# Altium schematic symbol library altera.SCHLIB: 68 symbols (part 3 of 6) (continued)
## EPF10K100A-P240 (continued)
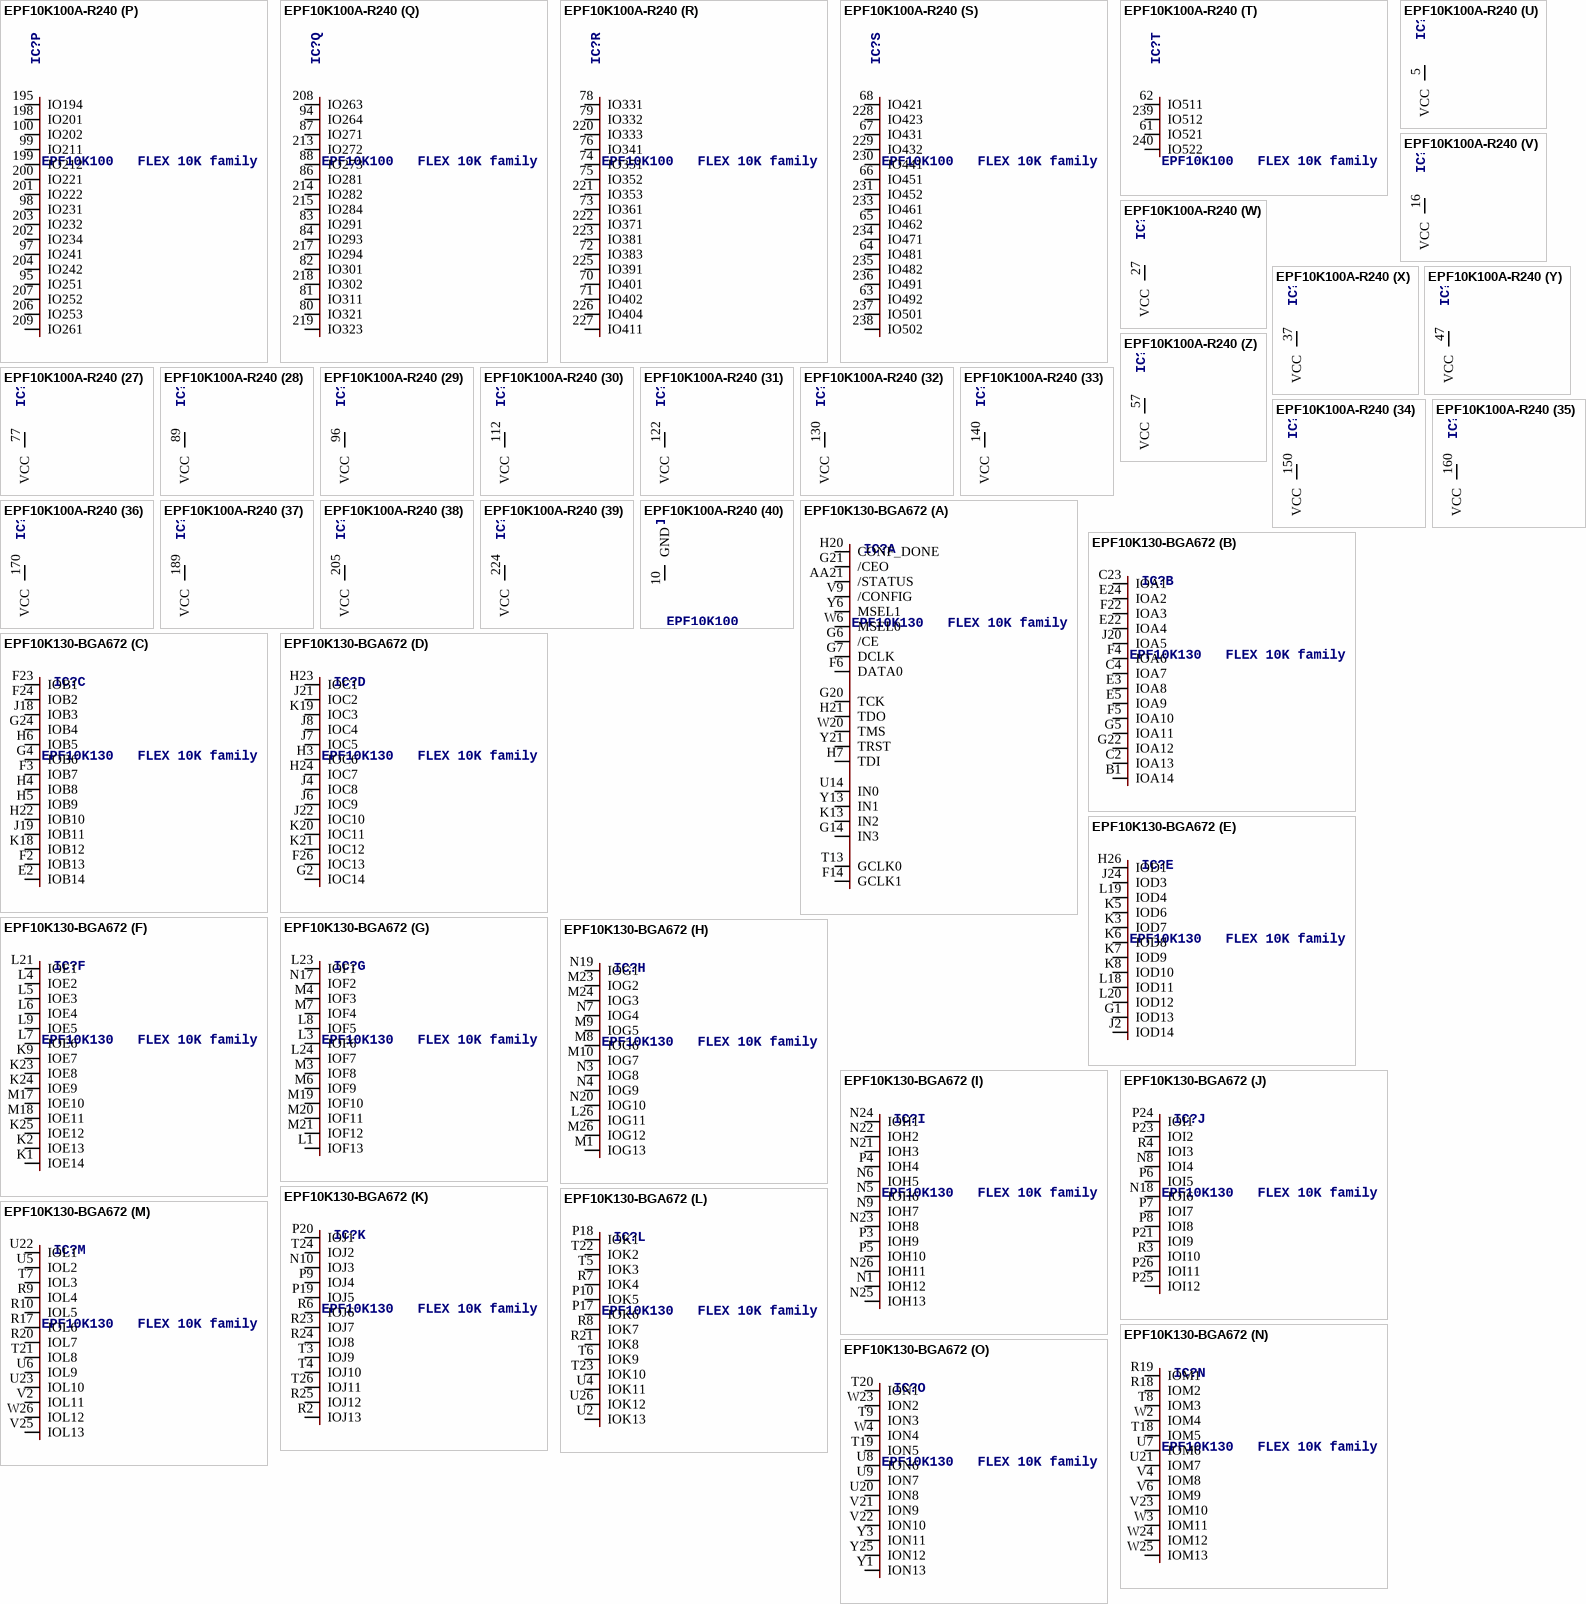
[diagram p23: symbols EPF10K100A-R240 to EPF10K130-BGA672]

## EPF10K100A-R240
designator IC?, comment EPF10K100   FLEX 10K family
MPN: EPF10K100ARC240-3N; OC_FARNELL: unknown; OC_NEWARK: 51R8800
footprint RQFP240
part A pins: 1 TCK, 2 CONF_DONE, 3 /CEO, 4 TDO, 58 TMS, 59 TRST, 60 /STATUS, 90 IN0, 91 GCLK0, 92 IN1, 121 /CONFIG, 123 MSEL1, 124 MSEL0, 177 TDI, 178 /CE, 179 DCLK, 180 DATA0, 210 IN2, 211 GCLK1, 212 IN3
part B pins: 6 IOA1, 7 IOA2, 8 IOA3, 9 IOA10, 11 IOA4, 171 IOA5, 172 IOA9, 173 IOA6, 174 IOA8, 175 IOA7
part C pins: 12 IOB1, 13 IOB2, 14 IOB16, 15 IOB3, 164 IOB5, 166 IOB6, 167 IOB9, 168 IOB8, 169 IOB7
part D pins: 17 IOC11, 18 IOC9, 19 IOC1, 20 IOC16, 21 IOC2, 159 IOC3, 161 IOC4, 162 IOC5, 163 IOC6
part E pins: 23 IOD1, 24 IOD2, 25 IOD3, 26 IOD4, 156 IOD5, 157 IOD6, 158 IOD7
part F pins: 28 IOE11, 29 IOE1, 30 IOE2, 152 IOE3, 153 IOE4, 154 IOE5
part G pins: 31 IOF7, 33 IOF1, 34 IOF2, 148 IOF3, 149 IOF4, 151 IOF5
part H pins: 35 IOG11, 36 IOG1, 38 IOG2, 144 IOG8, 146 IOG3, 147 IOG4
part I pins: 39 IOH1, 40 IOH2, 41 IOH3, 141 IOH4, 142 IOH8, 143 IOH5
part J pins: 43 IOI1, 44 IOI2, 45 IOI12, 137 IOI3, 138 IOI5, 139 IOI4
part K pins: 46 IOJ13, 48 IOJ1, 49 IOJ2, 133 IOJ14, 134 IOJ3, 136 IOJ5
part L pins: 50 IOK11, 51 IOK1, 53 IOK2, 129 IOK14, 131 IOK3, 132 IOK4
part M pins: 54 IOL1, 55 IOL2, 56 IOL3, 126 IOL11, 127 IOL4, 128 IOL5
part N pins: 109 IO113, 110 IO102, 111 IO91, 113 IO81, 114 IO71, 115 IO61, 116 IO51, 117 IO41, 118 IO31, 119 IO21, 120 IO11, 181 IO92, 182 IO101, 183 IO111, 184 IO121, 185 IO122
part O pins: 101 IO191, 102 IO181, 103 IO161, 105 IO151, 106 IO141, 107 IO131, 108 IO124, 186 IO132, 187 IO142, 188 IO143, 190 IO152, 191 IO164, 192 IO162, 193 IO171, 194 IO182, 196 IO192
part P pins: 95 IO251, 97 IO241, 98 IO231, 99 IO211, 100 IO202, 195 IO194, 198 IO201, 199 IO212, 200 IO221, 201 IO222, 202 IO234, 203 IO232, 204 IO242, 206 IO253, 207 IO252, 209 IO261
part Q pins: 80 IO321, 81 IO311, 82 IO301, 83 IO291, 84 IO293, 86 IO281, 87 IO271, 88 IO273, 94 IO264, 208 IO263, 213 IO272, 214 IO282, 215 IO284, 217 IO294, 218 IO302, 219 IO323
part R pins: 70 IO401, 71 IO402, 72 IO383, 73 IO361, 74 IO351, 75 IO352, 76 IO341, 78 IO331, 79 IO332, 220 IO333, 221 IO353, 222 IO371, 223 IO381, 225 IO391, 226 IO404, 227 IO411
part S pins: 63 IO492, 64 IO481, 65 IO462, 66 IO451, 67 IO431, 68 IO421, 228 IO423, 229 IO432, 230 IO441, 231 IO452, 233 IO461, 234 IO471, 235 IO482, 236 IO491, 237 IO501, 238 IO502
part T pins: 61 IO521, 62 IO511, 239 IO512, 240 IO522
part U pins: 5 VCC (power)
part V pins: 16 VCC (power)
part W pins: 27 VCC (power)
part X pins: 37 VCC (power)
part Y pins: 47 VCC (power)
part Z pins: 57 VCC (power)
part 27 pins: 77 VCC (power)
part 28 pins: 89 VCC (power)
part 29 pins: 96 VCC (power)
part 30 pins: 112 VCC (power)
part 31 pins: 122 VCC (power)
part 32 pins: 130 VCC (power)
part 33 pins: 140 VCC (power)
part 34 pins: 150 VCC (power)
part 35 pins: 160 VCC (power)
part 36 pins: 170 VCC (power)
part 37 pins: 189 VCC (power)
part 38 pins: 205 VCC (power)
part 39 pins: 224 VCC (power)
part 40 pins: 10 GND (power)
part 41 pins: 22 GND (power)
part 42 pins: 32 GND (power)
part 43 pins: 42 GND (power)
part 44 pins: 52 GND (power)
part 45 pins: 69 GND (power)
part 46 pins: 85 GND (power)
part 47 pins: 93 GND (power)
part 48 pins: 104 GND (power)
part 49 pins: 125 GND (power)
part 50 pins: 135 GND (power)
part 51 pins: 145 GND (power)
part 52 pins: 155 GND (power)
part 53 pins: 165 GND (power)
part 54 pins: 176 GND (power)
part 55 pins: 197 GND (power)
part 56 pins: 216 GND (power)
part 57 pins: 232 GND (power)

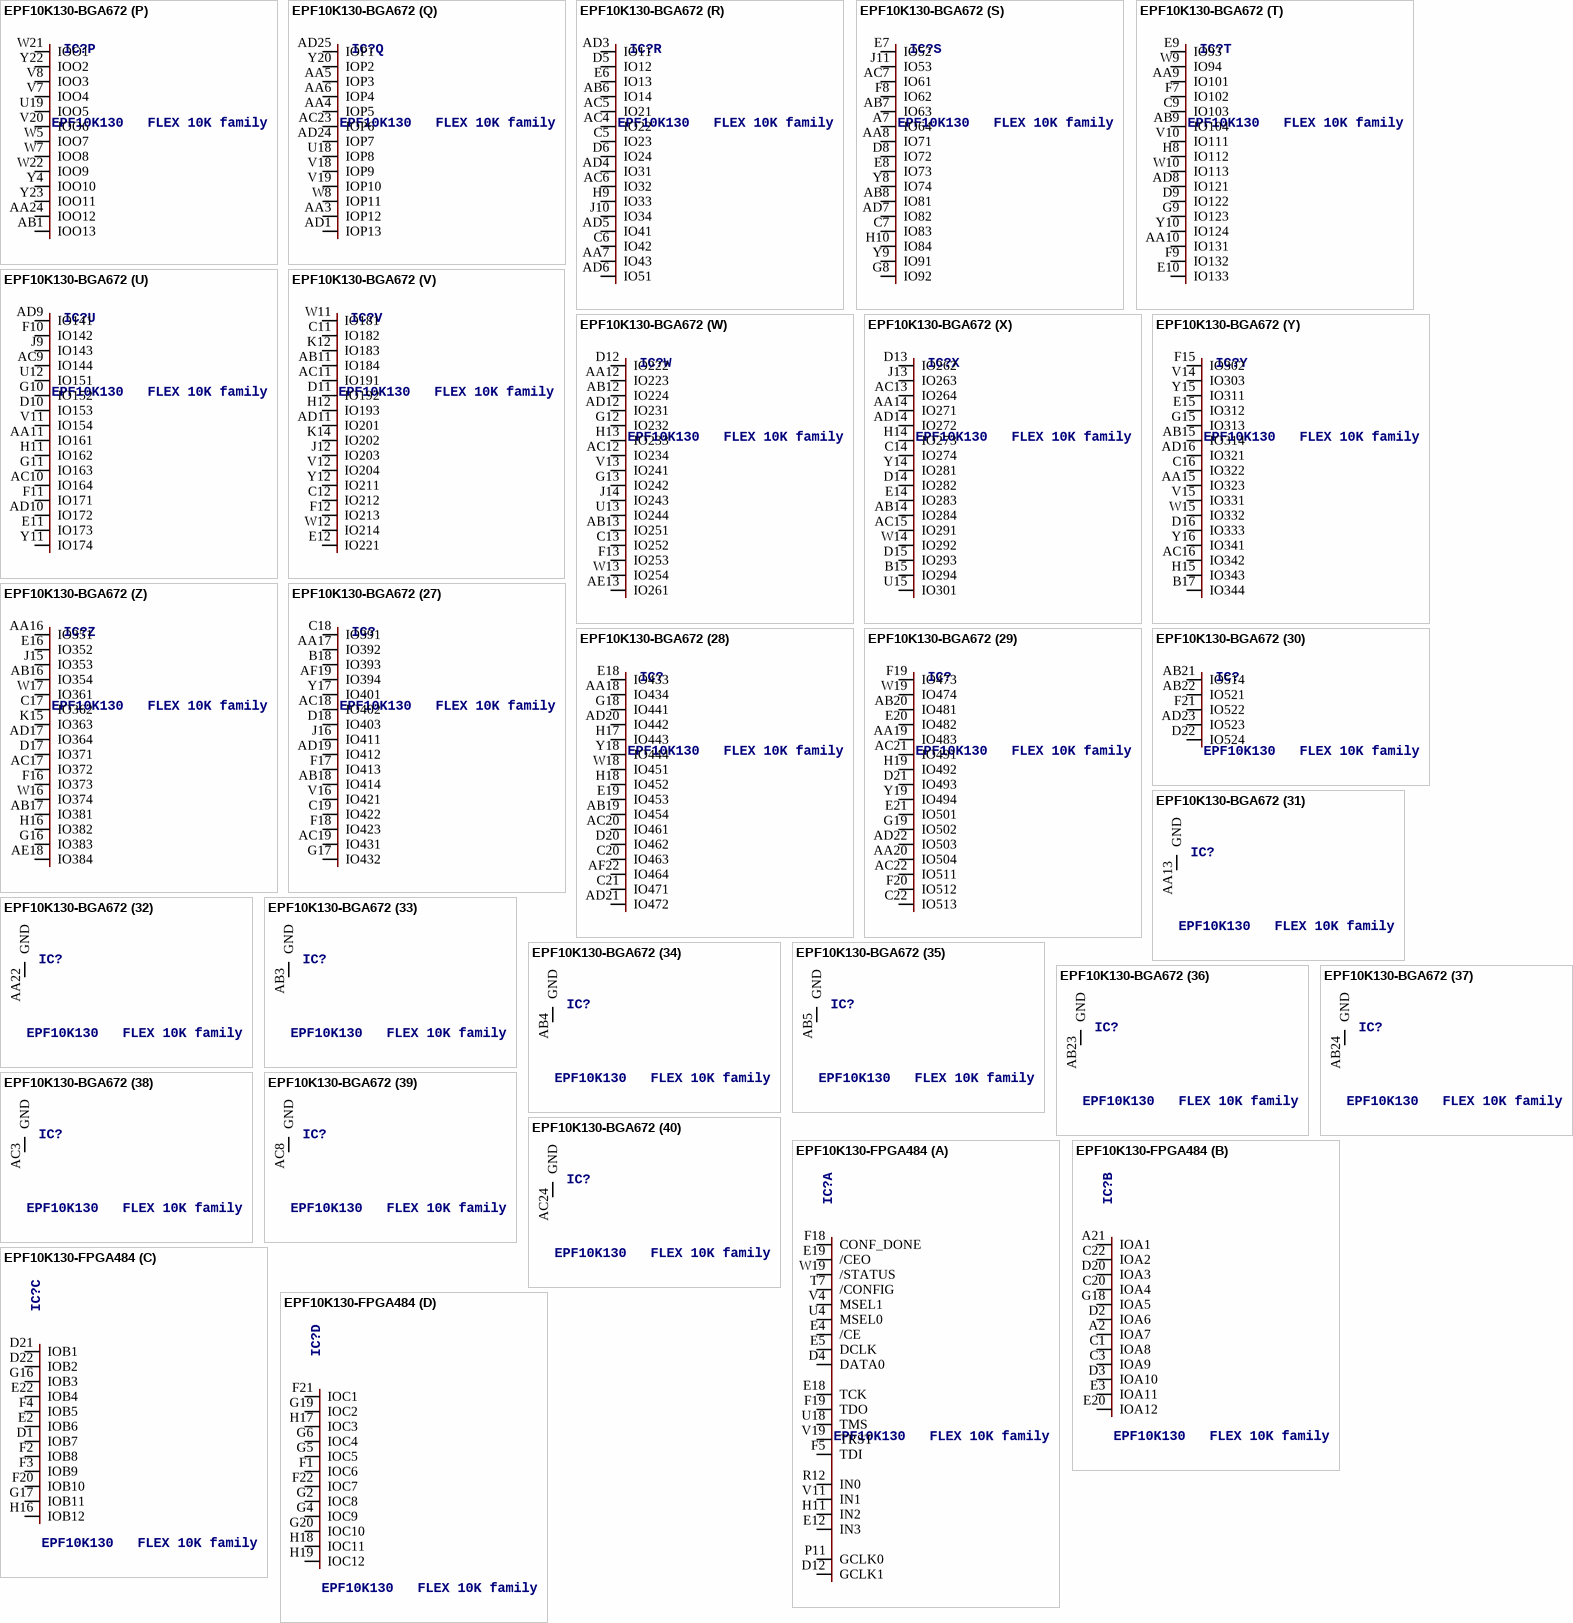
[diagram p24: symbols EPF10K130-BGA672 to EPF10K130-FPGA484]

## EPF10K130-BGA672
designator IC?, comment EPF10K130   FLEX 10K family
MPN: EPF10K130EFC672-1; OC_FARNELL: unknown; OC_NEWARK: 51R8863
footprint BGA672
part A pins: AA21 /STATUS, F6 DATA0, F14 GCLK1, G6 /CE, G7 DCLK, G14 IN3, G20 TCK, G21 /CEO, H7 TDI, H20 CONF_DONE, H21 TDO, K13 IN2, T13 GCLK0, U14 IN0, V9 /CONFIG, W6 MSEL0, W20 TMS, Y6 MSEL1, Y13 IN1, Y21 TRST
part B pins: B1 IOA14, C2 IOA13, C4 IOA7, C23 IOA1, E3 IOA8, E5 IOA9, E22 IOA4, E24 IOA2, F4 IOA6, F5 IOA10, F22 IOA3, G5 IOA11, G22 IOA12, J20 IOA5
part C pins: E2 IOB14, F2 IOB13, F3 IOB7, F23 IOB1, F24 IOB2, G4 IOB6, G24 IOB4, H4 IOB8, H5 IOB9, H6 IOB5, H22 IOB10, J18 IOB3, J19 IOB11, K18 IOB12
part D pins: F26 IOC13, G2 IOC14, H3 IOC6, H23 IOC1, H24 IOC7, J4 IOC8, J6 IOC9, J7 IOC5, J8 IOC4, J21 IOC2, J22 IOC10, K19 IOC3, K20 IOC11, K21 IOC12
part E pins: G1 IOD13, H26 IOD1, J2 IOD14, J24 IOD3, K3 IOD7, K5 IOD6, K6 IOD8, K7 IOD9, K8 IOD10, L18 IOD11, L19 IOD4, L20 IOD12
part F pins: K1 IOE14, K2 IOE13, K9 IOE7, K23 IOE8, K24 IOE9, K25 IOE12, L4 IOE2, L5 IOE3, L6 IOE4, L7 IOE6, L9 IOE5, L21 IOE1, M17 IOE10, M18 IOE11
part G pins: L1 IOF13, L3 IOF6, L8 IOF5, L23 IOF1, L24 IOF7, M3 IOF8, M4 IOF3, M6 IOF9, M7 IOF4, M19 IOF10, M20 IOF11, M21 IOF12, N17 IOF2
part H pins: L26 IOG11, M1 IOG13, M8 IOG6, M9 IOG5, M10 IOG7, M23 IOG2, M24 IOG3, M26 IOG12, N3 IOG8, N4 IOG9, N7 IOG4, N19 IOG1, N20 IOG10
part I pins: N1 IOH12, N5 IOH6, N6 IOH5, N9 IOH7, N21 IOH3, N22 IOH2, N23 IOH8, N24 IOH1, N25 IOH13, N26 IOH11, P3 IOH9, P4 IOH4, P5 IOH10
part J pins: N8 IOI4, N18 IOI6, P6 IOI5, P7 IOI7, P8 IOI8, P21 IOI9, P23 IOI2, P24 IOI1, P25 IOI12, P26 IOI11, R3 IOI10, R4 IOI3
part K pins: N10 IOJ3, P9 IOJ4, P19 IOJ5, P20 IOJ1, R2 IOJ13, R6 IOJ6, R23 IOJ7, R24 IOJ8, R25 IOJ12, T3 IOJ9, T4 IOJ10, T24 IOJ2, T26 IOJ11
part L pins: P10 IOK5, P17 IOK6, P18 IOK1, R7 IOK4, R8 IOK7, R21 IOK8, T5 IOK3, T6 IOK9, T22 IOK2, T23 IOK10, U2 IOK13, U4 IOK11, U26 IOK12
part M pins: R9 IOL4, R10 IOL5, R17 IOL6, R20 IOL7, T7 IOL3, T21 IOL8, U5 IOL2, U6 IOL9, U22 IOL1, U23 IOL10, V2 IOL11, V25 IOL13, W26 IOL12
part N pins: R18 IOM2, R19 IOM1, T8 IOM3, T18 IOM5, U7 IOM6, U21 IOM7, V4 IOM8, V6 IOM9, V23 IOM10, W2 IOM4, W3 IOM11, W24 IOM12, W25 IOM13
part O pins: T9 ION3, T19 ION5, T20 ION1, U8 ION6, U9 ION7, U20 ION8, V21 ION9, V22 ION10, W4 ION4, W23 ION2, Y1 ION13, Y3 ION11, Y25 ION12
part P pins: AA24 IOO12, AB1 IOO13, U19 IOO5, V7 IOO4, V8 IOO3, V20 IOO6, W5 IOO7, W7 IOO8, W21 IOO1, W22 IOO9, Y4 IOO10, Y22 IOO2, Y23 IOO11
part Q pins: AA3 IOP12, AA4 IOP5, AA5 IOP3, AA6 IOP4, AC23 IOP6, AD1 IOP13, AD24 IOP7, AD25 IOP1, U18 IOP8, V18 IOP9, V19 IOP10, W8 IOP11, Y20 IOP2
part R pins: AA7 IO43, AB6 IO14, AC4 IO22, AC5 IO21, AC6 IO32, AD3 IO11, AD4 IO31, AD5 IO41, AD6 IO51, C5 IO23, C6 IO42, D5 IO12, D6 IO24, E6 IO13, H9 IO33, J10 IO34
part S pins: A7 IO64, AA8 IO71, AB7 IO63, AB8 IO81, AC7 IO61, AD7 IO82, C7 IO83, D8 IO72, E7 IO52, E8 IO73, F8 IO62, G8 IO92, H10 IO84, J11 IO53, Y8 IO74, Y9 IO91
part T pins: AA9 IO101, AA10 IO131, AB9 IO104, AD8 IO121, C9 IO103, D9 IO122, E9 IO93, E10 IO133, F7 IO102, F9 IO132, G9 IO123, H8 IO112, V10 IO111, W9 IO94, W10 IO113, Y10 IO124
part U pins: AA11 IO161, AC9 IO144, AC10 IO164, AD9 IO141, AD10 IO172, D10 IO153, E11 IO173, F10 IO142, F11 IO171, G10 IO152, G11 IO163, H11 IO162, J9 IO143, U12 IO151, V11 IO154, Y11 IO174
part V pins: AB11 IO184, AC11 IO191, AD11 IO201, C11 IO182, C12 IO212, D11 IO192, E12 IO221, F12 IO213, H12 IO193, J12 IO203, K12 IO183, K14 IO202, V12 IO204, W11 IO181, W12 IO214, Y12 IO211
part W pins: AA12 IO223, AB12 IO224, AB13 IO251, AC12 IO234, AD12 IO231, AE13 IO261, C13 IO252, D12 IO222, F13 IO253, G12 IO232, G13 IO242, H13 IO233, J14 IO243, U13 IO244, V13 IO241, W13 IO254
part X pins: AA14 IO271, AB14 IO284, AC13 IO264, AC15 IO291, AD14 IO272, B15 IO294, C14 IO274, D13 IO262, D14 IO282, D15 IO293, E14 IO283, H14 IO273, J13 IO263, U15 IO301, W14 IO292, Y14 IO281
part Y pins: AA15 IO323, AB15 IO314, AC16 IO342, AD16 IO321, B17 IO344, C16 IO322, D16 IO333, E15 IO312, F15 IO302, G15 IO313, H15 IO343, V14 IO303, V15 IO331, W15 IO332, Y15 IO311, Y16 IO341
part Z pins: AA16 IO351, AB16 IO354, AB17 IO381, AC17 IO372, AD17 IO364, AE18 IO384, C17 IO362, D17 IO371, E16 IO352, F16 IO373, G16 IO383, H16 IO382, J15 IO353, K15 IO363, W16 IO374, W17 IO361
part 27 pins: AA17 IO392, AB18 IO414, AC18 IO402, AC19 IO431, AD19 IO412, AF19 IO394, B18 IO393, C18 IO391, C19 IO422, D18 IO403, F17 IO413, F18 IO423, G17 IO432, J16 IO411, V16 IO421, Y17 IO401
part 28 pins: AA18 IO434, AB19 IO454, AC20 IO461, AD20 IO442, AD21 IO472, AF22 IO464, C20 IO463, C21 IO471, D20 IO462, E18 IO433, E19 IO453, G18 IO441, H17 IO443, H18 IO452, W18 IO451, Y18 IO444
part 29 pins: AA19 IO483, AA20 IO504, AB20 IO481, AC21 IO491, AC22 IO511, AD22 IO503, C22 IO513, D21 IO493, E20 IO482, E21 IO501, F19 IO473, F20 IO512, G19 IO502, H19 IO492, W19 IO474, Y19 IO494
part 30 pins: AB21 IO514, AB22 IO521, AD23 IO523, D22 IO524, F21 IO522
part 31 pins: AA13 GND (power)
part 32 pins: AA22 GND (power)
part 33 pins: AB3 GND (power)
part 34 pins: AB4 GND (power)
part 35 pins: AB5 GND (power)
part 36 pins: AB23 GND (power)
part 37 pins: AB24 GND (power)
part 38 pins: AC3 GND (power)
part 39 pins: AC8 GND (power)
part 40 pins: AC24 GND (power)
part 41 pins: AD13 GND (power)
part 42 pins: AD18 GND (power)
part 43 pins: AE2 GND (power)
part 44 pins: AE25 GND (power)
part 45 pins: AF2 GND (power)
part 46 pins: AF25 GND (power)
part 47 pins: A2 GND (power)
part 48 pins: A25 GND (power)
part 49 pins: B2 GND (power)
part 50 pins: B25 GND (power)
part 51 pins: C3 GND (power)
part 52 pins: C10 GND (power)
part 53 pins: C24 GND (power)
part 54 pins: D3 GND (power)
part 55 pins: D4 GND (power)
part 56 pins: D19 GND (power)
part 57 pins: D23 GND (power)
part 58 pins: D24 GND (power)
part 59 pins: E4 GND (power)
part 60 pins: E23 GND (power)
part 61 pins: G23 GND (power)
part 62 pins: J5 GND (power)
part 63 pins: J23 GND (power)
part 64 pins: K4 GND (power)
part 65 pins: K10 GND (power)
part 66 pins: K17 GND (power)
part 67 pins: L11 GND (power)
part 68 pins: L16 GND (power)
part 69 pins: L22 GND (power)
part 70 pins: M5 GND (power)
part 71 pins: M12 GND (power)
part 72 pins: M14 GND (power)
part 73 pins: M15 GND (power)
part 74 pins: N13 GND (power)
part 75 pins: N14 GND (power)
part 76 pins: P13 GND (power)
part 77 pins: P14 GND (power)
part 78 pins: P22 GND (power)
part 79 pins: R12 GND (power)
part 80 pins: R15 GND (power)
part 81 pins: T11 GND (power)
part 82 pins: T16 GND (power)
part 83 pins: U10 GND (power)
part 84 pins: U17 GND (power)
part 85 pins: U24 GND (power)
part 86 pins: V3 GND (power)
part 87 pins: Y5 GND (power)
part 88 pins: AA23 VCC (power)
part 89 pins: AB10 VCC (power)
part 90 pins: AC14 VCC (power)
part 91 pins: E13 VCC (power)
part 92 pins: E17 VCC (power)
part 93 pins: H2 VCC (power)
part 94 pins: H25 VCC (power)
part 95 pins: K16 VCC (power)
part 96 pins: L10 VCC (power)
part 97 pins: L12 VCC (power)
part 98 pins: L14 VCC (power)
part 99 pins: L17 VCC (power)
part 100 pins: M2 VCC (power)
part 101 pins: M25 VCC (power)
part 102 pins: N11 VCC (power)
part 103 pins: N12 VCC (power)
part 104 pins: N15 VCC (power)
part 105 pins: P12 VCC (power)
part 106 pins: P15 VCC (power)
part 107 pins: P16 VCC (power)
part 108 pins: R14 VCC (power)
part 109 pins: T2 VCC (power)
part 110 pins: T10 VCC (power)
part 111 pins: T12 VCC (power)
part 112 pins: T14 VCC (power)
part 113 pins: T17 VCC (power)
part 114 pins: T25 VCC (power)
part 115 pins: U16 VCC (power)
part 116 pins: Y7 VCC (power)
part 117 pins: AA26 VCCIO (power)
part 118 pins: AD15 VCCIO (power)
part 119 pins: C8 VCCIO (power)
part 120 pins: C15 VCCIO (power)
part 121 pins: D7 VCCIO (power)
part 122 pins: G3 VCCIO (power)
part 123 pins: J3 VCCIO (power)
part 124 pins: J17 VCCIO (power)
part 125 pins: K11 VCCIO (power)
part 126 pins: K22 VCCIO (power)
part 127 pins: L13 VCCIO (power)
part 128 pins: L15 VCCIO (power)
part 129 pins: M11 VCCIO (power)
part 130 pins: M13 VCCIO (power)
part 131 pins: M16 VCCIO (power)
part 132 pins: M22 VCCIO (power)
part 133 pins: N16 VCCIO (power)
part 134 pins: P11 VCCIO (power)
part 135 pins: R5 VCCIO (power)
part 136 pins: R11 VCCIO (power)
part 137 pins: R13 VCCIO (power)
part 138 pins: R16 VCCIO (power)
part 139 pins: R22 VCCIO (power)
part 140 pins: T15 VCCIO (power)
part 141 pins: U3 VCCIO (power)
part 142 pins: U11 VCCIO (power)
part 143 pins: V5 VCCIO (power)
part 144 pins: V17 VCCIO (power)
part 145 pins: V24 VCCIO (power)
part 146 pins: Y2 VCCIO (power)
part 147 pins: Y24 VCCIO (power)
part 148 pins: AA1 NC
part 149 pins: AA2 NC
part 150 pins: AA25 NC
part 151 pins: AB2 NC
part 152 pins: AB25 NC
part 153 pins: AB26 NC
part 154 pins: AC1 NC
part 155 pins: AC2 NC
part 156 pins: AC25 NC
part 157 pins: AC26 NC
part 158 pins: AD2 NC
part 159 pins: AD26 NC
part 160 pins: AE1 NC
part 161 pins: AE3 NC
part 162 pins: AE4 NC
part 163 pins: AE5 NC
part 164 pins: AE6 NC
part 165 pins: AE7 NC
part 166 pins: AE8 NC
part 167 pins: AE9 NC
part 168 pins: AE10 NC
part 169 pins: AE11 NC
part 170 pins: AE12 NC
part 171 pins: AE14 NC
part 172 pins: AE15 NC
part 173 pins: AE16 NC
part 174 pins: AE17 NC
part 175 pins: AE19 NC
part 176 pins: AE20 NC
part 177 pins: AE21 NC
part 178 pins: AE22 NC
part 179 pins: AE23 NC
part 180 pins: AE24 NC
part 181 pins: AE26 NC
part 182 pins: AF3 NC